# Altium schematic symbol library BARKO_SCHLIB.SchLib: 1064 symbols (part 3 of 11) (continued)
## CON-U.FL (continued)
CONN UMCC JACK STR 50OHM SMD; Manufacturer: TE Connectivity AMP; Manufacturer Part Number: 1909763-1; Body Material: Polymer,Liquid Crystal Polymer; Body Plating: Gold; Dielectric Material: Polymer; Connector System: Cable-to-Board; Number of Positions: 1; Frequency: 6GHz; Sealable: No (Without); Gender: Female; Impedance: 50R; Washability: OK; .Creator: M.OZKAN; .PCBCHK: USED; Supplier 1: Digi-Key; Supplier Part Number 1: A118077CT-ND; Stock 1: 93118; Pricing 1: 1=0.50000, 10=0.47200, 100=0.36150, 500=0.31436, 1000=0.25935 (USD); RoHS: Yes; Mount: Panel; Case/Package: SMD/SMT; Contact Plating: Gold; Contact Material: Copper Alloy; Housing Color: Beige; Insulation Material: Thermoplastic; Min Operating Temperature: -40°C; Max Operating Temperature: 194°C; Max Frequency: 6GHz; Termination: SMD/SMT; Packaging: Tape and Reel; Package Quantity: 1; Fastening Type: Push,Pull; Orientation: Straight; Connector Type: Jack; Length: 3mm; Radiation Hardening: No; ELV: Compliant; Lead Free: Lead Free; ComponentLink1URL: https://datasheet.ciiva.com/16312/eng-cd-1909763-b-16312469.pdf?src-supplier=Future+Electronics; ComponentLink1Description: https://datasheet.ciiva.com/16312/eng-cd-1909763-b-16312469.pdf?src-supplier=Future+Electronics; ComponentLink2URL: https://datasheet.ciiva.com/16469/eng-cd-1909763-b-16469221.pdf?src-supplier=Avnet+Asia; ComponentLink2Description: https://datasheet.ciiva.com/16469/eng-cd-1909763-b-16469221.pdf?src-supplier=Avnet+Asia; ComponentLink3URL: https://datasheet.ciiva.com/9423/eng-cd-1909763-b-9423785.pdf?src-supplier=Avnet; ComponentLink3Description: https://datasheet.ciiva.com/9423/eng-cd-1909763-b-9423785.pdf?src-supplier=Avnet; ComponentLink4URL: https://datasheet.ciiva.com/29191/eng-cd-1909763-b1-basefilename-29191146.pdf?src-supplier=Digi-Key; ComponentLink4Description: https://datasheet.ciiva.com/29191/eng-cd-1909763-b1-basefilename-29191146.pdf?src-supplier=Digi-Key; ComponentLink5URL: https://datasheet.ciiva.com/29191/eng-cd-1909763-b1-basefilename-29191148.pdf?src-supplier=Digi-Key; ComponentLink5Description: https://datasheet.ciiva.com/29191/eng-cd-1909763-b1-basefilename-29191148.pdf?src-supplier=Digi-Key; .SCHCHK: USED
footprint TECO-1909763-1_V (SMD, 3-Leads, Body 2.6x2.6mm, Height 1.25mm)
pins: 1, 2, 3

## CON-USB 2.0 Type B Micro
designator J?, comment USB Micro
CONN RCPT USB2.0 MICRO B SMD R/A; Manufacturer Part Number: 5UR2B01MF-105G0BUHR1; Washability: OK; .Creator: M.OZKAN; .PCBCHK: USED; .SCHCHK: USED
footprint CON-Micro USB 2.0 (Micro USB 2.0 SMT Type B Horizontal 5 Contacts)
pins: 1 VCC, 2 D-, 3 D+, 4 ID, 5 GND, S1 Shield, S2 Shield, S3 Shield, S4 Shield

## CON-USBA-SMD
designator J?  (value not drawn)
CONN USB A TYPE ULTRA FLAT SMD; Manufacturer: CNC Tech; Manufacturer Part Number: 1001-011-01101; Number of Contacts: 4; Gender: Male; .PCBCHK: USED; .Creator: F:TALI; Washability: OK; Supplier 1: Digi-Key; Stock 1: 34588; Pricing 1: 1=0.77, 10=0.72, 25=0.648, 50=0.576, 100=0.552, 250=0.504, 500=0.48, 1000=0.396, 2500=0.36 (USD); Mount: Horizontal,Surface Mount; Package Quantity: 100; Packaging: Bulk; Connector Type: USB; ComponentLink1URL: http://cnctech.us/pdfs/1001-011-01101.pdf; ComponentLink1Description: http://cnctech.us/pdfs/1001-011-01101.pdf; Supplier Part Number 1: 1175-1008-ND; .SCHCHK: USED
pins: 1 VCC (power), 2 D-, 3 D+, 4 GND (power), S1, S2

## CRYSTAL-8MHZ
designator Y?, comment 8MHZ
CRYSTAL 8.0000MHZ 20PF SMD; Manufacturer: CTS; Manufacturer Part Number: ATS08ASM-1E; Frequency Tolerance: 30ppm; ESR (Equivalent Series Resistance): 60R; Frequency Stability: 50ppm; .PCBCHK: USED; .Creator: F:TALI; Washability: OK; Supplier 1: Digi-Key; Stock 1: 18000; Pricing 1: 1000=0.1952, 3000=0.183, 5000=0.1769, 10000=0.1708 (USD); Mount: Surface Mount; Case/Package: Metal; Number of Pins: 2; Contact Plating: Copper,Silver,Tin; Min Operating Temperature: -40°C; Max Operating Temperature: 85°C; Load Capacitance: 20pF; Frequency: 8MHz; Packaging: Tape and Reel; Package Quantity: 1000; Tolerance: 30ppm; Termination: SMD/SMT; Series Resistance: 60R; Length: 0.437inch; Height: 0.169inch; Width: 3.8mm; Lead Free: Lead Free; ComponentLink1URL: http://www.ctscorp.com/wp-content/uploads/2015/11/008-0309-0.pdf; ComponentLink1Description: http://www.ctscorp.com/wp-content/uploads/2015/11/008-0309-0.pdf; ComponentLink2URL: http://www.mouser.com/ds/2/96/008-0309-0-32667.pdf; ComponentLink2Description: http://www.mouser.com/ds/2/96/008-0309-0-32667.pdf; ComponentLink3URL: http://www.ctscorp.com/wp-content/uploads/ATS-ATSSM.pdf; ComponentLink3Description: http://www.ctscorp.com/wp-content/uploads/ATS-ATSSM.pdf; ComponentLink4URL: https://www.ctscorp.com/wp-content/uploads/ATS-ATSSM.pdf; ComponentLink4Description: https://www.ctscorp.com/wp-content/uploads/ATS-ATSSM.pdf; Supplier Part Number 1: CTX1055TR-ND; .SCHCHK: USED
footprint CRYSTAL1
pins: 1, 2

## CRYSTAL-16MHZ
designator Y?, comment 16MHZ
CRYSTAL 16MHZ 12PF SMD; Manufacturer: Raltron Electronics; Manufacturer Part Number: RH100-16.000-12-3050-EX; .Creator: F:TALI; .PCBCHK: USED; Washability: OK; .SCHCHK: USED; Supplier 1: Digi-Key; Supplier Part Number 1: 2151-RH100-16.000-12-1010-EXT-TRCT-ND; Stock 1: 3000; Pricing 1: 1=0.68000, 10=0.59800, 50=0.55900, 100=0.49400, 500=0.46800, 1000=0.39000 (USD); ComponentLink1URL: http://datasheet.octopart.com/RH100-16.000-12-1010-EXT-TR-Raltron-Electronics-datasheet-137142244.pdf?src-supplier=Raltron+Electronics; ComponentLink1Description: http://datasheet.octopart.com/RH100-16.000-12-1010-EXT-TR-Raltron-Electronics-datasheet-137142244.pdf?src-supplier=Raltron+Electronics
footprint CRYSTAL-3.2X2.5
pins: 1, 2, 3, 4

## CRYSTAL-32Khz 4-SOJ
designator X?, comment ABS25-32.768K  Supplier Part Number 1: 535-9166-1-ND
CRYSTAL 32.7680KHZ 12.5PF SMD; Manufacturer: Abracon; Manufacturer Part Number: ABS25-32.768KHZ-T; Frequency: 32.768kHz; Frequency Tolerance: 20ppm; ESR (Equivalent Series Resistance): 50kR; Washability: OK; .Creator: M.OZKAN; .PCBCHK: USED; Supplier 1: Digi-Key; Stock 1: 461783; Pricing 1: 1=0.63000, 10=0.52300, 50=0.47020, 100=0.41800, 500=0.39710, 1000=0.33440 (USD); RoHS: Yes; Mount: Surface Mount; Case/Package: SMD/SMT; Number of Pins: 4; Min Operating Temperature: -40°C; Max Operating Temperature: 85°C; Load Capacitance: 12.5pF; Packaging: Tape and Reel; Package Quantity: 1000; Tolerance: 20ppm; Termination: SMD/SMT; Series Resistance: 50kR; Length: 8mm; Height: 0.098inch; Width: 0.15inch; Depth: 3.8mm; Radiation Hardening: No; Lead Free: Lead Free; REACH SVHC: No SVHC; ComponentLink1URL: https://datasheet.ciiva.com/7998/1700987-7998663.pdf?src-supplier=Element14; ComponentLink1Description: https://datasheet.ciiva.com/7998/1700987-7998663.pdf?src-supplier=Element14; ComponentLink2URL: https://datasheet.ciiva.com/854/abs25-854195.pdf?src-supplier=Digi-Key; ComponentLink2Description: https://datasheet.ciiva.com/854/abs25-854195.pdf?src-supplier=Digi-Key; ComponentLink3URL: https://datasheet.ciiva.com/854/abs25-854197.pdf?src-supplier=Digi-Key; ComponentLink3Description: https://datasheet.ciiva.com/854/abs25-854197.pdf?src-supplier=Digi-Key; ComponentLink4URL: https://datasheet.ciiva.com/16336/abs25-16336119.pdf?src-supplier=Future+Electronics; ComponentLink4Description: https://datasheet.ciiva.com/16336/abs25-16336119.pdf?src-supplier=Future+Electronics; ComponentLink5URL: https://datasheet.ciiva.com/26812/getdatasheetpartid-719721-26812171.pdf?src-supplier=Verical; ComponentLink5Description: https://datasheet.ciiva.com/26812/getdatasheetpartid-719721-26812171.pdf?src-supplier=Verical; ComponentLink6URL: https://datasheet.ciiva.com/854/abs25-854196.pdf?src-supplier=Digi-Key; ComponentLink6Description: https://datasheet.ciiva.com/854/abs25-854196.pdf?src-supplier=Digi-Key; ComponentLink7URL: https://datasheet.ciiva.com/28508/1856019-28508682.pdf?src-supplier=Element14; ComponentLink7Description: https://datasheet.ciiva.com/28508/1856019-28508682.pdf?src-supplier=Element14; .SCHCHK: USED
footprint ABRA-ABS25-4_V (SMD, 4-Leads, Body 8x3.8mm, Pitch 5.5mm, Height 2.5mm)
pins: 1 X1, 2 NC, 3 NC, 4 X2

## CRYSTAL-ABM3-8.000MHZ-D2Y-T
designator X?, comment Frequency: 8MHz  (hidden comment: CRY-ABM3-8.000MHZ)
CRYSTAL 8.0000MHZ 18PF SMD; Manufacturer: Abracon; Manufacturer Part Number: ABM3-8.000MHZ-D2Y-T; ESR (Equivalent Series Resistance): 500R; Frequency Tolerance: 20ppm; Frequency Stability: 30ppm; Washability: OK; .Creator: M.OZKAN; .PCBCHK: USED; Supplier 1: Digi-Key; Stock 1: 89429; Pricing 1: 1=1,14000, 10=1,01200, 50=0,94600, 100=0,83600, 500=0,79200 (USD); RoHS: Yes; Mount: Surface Mount; Case/Package: CSMD; Number of Pins: 2; Min Operating Temperature: -40°C; Max Operating Temperature: 85°C; Load Capacitance: 18pF; Packaging: Tape and Reel; Tolerance: 20ppm; Package Quantity: 1000; Termination: SMD/SMT; Composition: Ceramic; Series Resistance: 500R; Length: 5mm; Height: 0.051inch; Width: 3.2mm; Depth: 3.2mm; Radiation Hardening: No; REACH SVHC: Unknown; Lead Free: Lead Free; ComponentLink1URL: https://datasheet.ciiva.com/4945/abm3-47699-4945424.pdf?src-supplier=Mouser; ComponentLink1Description: https://datasheet.ciiva.com/4945/abm3-47699-4945424.pdf?src-supplier=Mouser; ComponentLink2URL: https://datasheet.ciiva.com/862/abm3-862465.pdf?src-supplier=Digi-Key; ComponentLink2Description: https://datasheet.ciiva.com/862/abm3-862465.pdf?src-supplier=Digi-Key; ComponentLink3URL: https://datasheet.ciiva.com/862/abm3-862466.pdf?src-supplier=Digi-Key; ComponentLink3Description: https://datasheet.ciiva.com/862/abm3-862466.pdf?src-supplier=Digi-Key; ComponentLink4URL: https://datasheet.ciiva.com/862/abm3-862467.pdf?src-supplier=Digi-Key; ComponentLink4Description: https://datasheet.ciiva.com/862/abm3-862467.pdf?src-supplier=Digi-Key; ComponentLink5URL: https://datasheet.ciiva.com/1357/1754353-1357270.pdf?src-supplier=Element14; ComponentLink5Description: https://datasheet.ciiva.com/1357/1754353-1357270.pdf?src-supplier=Element14; ComponentLink6URL: https://datasheet.ciiva.com/3174/abm3-3174137.pdf?src-supplier=Avnet; ComponentLink6Description: https://datasheet.ciiva.com/3174/abm3-3174137.pdf?src-supplier=Avnet; ComponentLink7URL: https://datasheet.ciiva.com/26812/getdatasheetpartid-723821-26812186.pdf?src-supplier=Verical; ComponentLink7Description: https://datasheet.ciiva.com/26812/getdatasheetpartid-723821-26812186.pdf?src-supplier=Verical; ComponentLink8URL: https://datasheet.ciiva.com/5788/abm3-5788043.pdf?src-supplier=Farnell; ComponentLink8Description: https://datasheet.ciiva.com/5788/abm3-5788043.pdf?src-supplier=Farnell; ComponentLink9URL: https://datasheet.ciiva.com/16392/abm3-16392475.pdf?src-supplier=Future+Electronics; ComponentLink9Description: https://datasheet.ciiva.com/16392/abm3-16392475.pdf?src-supplier=Future+Electronics; ComponentLink10URL: https://datasheet.ciiva.com/7998/abm3-7998589.pdf?src-supplier=Element14; ComponentLink10Description: https://datasheet.ciiva.com/7998/abm3-7998589.pdf?src-supplier=Element14; Supplier Part Number 1: 535-10630-1-ND; .SCHCHK: USED
footprint SMD_5.00x 3.20x1.3_2P - duplicate
pins: 1, 2

## CRYSTAL-ECS-3225MV
designator Y?, comment ECS-3225MV
XTAL OSC XO 16.0000MHZ HCMOS SMD; Manufacturer: ECS International; Manufacturer Part Number: ECS-3225MV-160-BN-TR; Washability: OK; .Creator: M.OZKAN; .PCBCHK: USED; Supplier 1: Digi-Key; Stock 1: 740; Pricing 1: 1=0.92000, 10=0.81700, 50=0.76380, 100=0.67510, 500=0.63954 (USD); RoHS: No; ComponentLink1URL: https://www.ecsxtal.com/store/pdf/ECS-3225MV.pdf?src-supplier=Digi-Key; ComponentLink1Description: https://www.ecsxtal.com/store/pdf/ECS-3225MV.pdf?src-supplier=Digi-Key; Supplier Part Number 1: XC2875CT-ND; .SCHCHK: USED
footprint CRYSTAL-3.2X2.5
pins: 1 NC, 2 GND, 3 OUT, 4 VDD

## CRYSTAL-RH100-25.000
designator Y?, comment 25MHz
Xtal 25MHZ 10PF SMD; Manufacturer: Raltron Electronics; Manufacturer Part Number: RH100-25.000-18-F-3030-T; Washability: OK; .Creator: M.OZKAN; .PCBCHK: USED; Supplier 1: Digi-Key; Supplier Part Number 1: 2151-RH100-25.000-10-F-2030-EXT-TRCT-ND; Stock 1: 3000; Pricing 1: 1=0.68000, 10=0.59800, 50=0.55900, 100=0.49400, 500=0.46800, 1000=0.39000 (USD); ComponentLink1URL: http://datasheet.octopart.com/RH100-25.000-10-F-2030-EXT-TR-Raltron-Electronics-datasheet-137142244.pdf?src-supplier=Raltron+Electronics; ComponentLink1Description: http://datasheet.octopart.com/RH100-25.000-10-F-2030-EXT-TR-Raltron-Electronics-datasheet-137142244.pdf?src-supplier=Raltron+Electronics; .SCHCHK: USED
footprint CRYSTAL-3.2X2.5
pins: 1, 2, 3, 4

## CRYSTAL-TSX-3225 16.0000MF18X-AC0
designator Y?, comment 16MHz
CRYSTAL 16.00 MHZ 9PF SMD; Manufacturer: Epson; Manufacturer Part Number: TSX-3225 16.0000MF18X-AC0; ESR (Equivalent Series Resistance): 60R; Frequency Stability: 18ppm; Frequency Tolerance: 10ppm; Supplier 1: Digi-Key; Supplier Part Number 1: SER4070CT-ND; Stock: 467; Pricing: 1=0.33, 10=0.275, 50=0.2476, 100=0.22, 500=0.209 (USD); RoHS: Yes; Mount: Surface Mount; Case/Package: SMD/SMT; Min Operating Temperature: -20°C; Max Operating Temperature: 75°C; Packaging: Tape and Reel; Frequency: 16MHz; Load Capacitance: 9pF; Length: 0.126inch; Width: 0.098inch; Height: 0.024inch; ComponentLink1URL: https://www.eea.epson.com/wp-content/uploads/2016/11/November-2016-PCS-MASTER-BOOK.pdf?src-supplier=Verical; ComponentLink1Description: https://www.eea.epson.com/wp-content/uploads/2016/11/November-2016-PCS-MASTER-BOOK.pdf?src-supplier=Verical; ComponentLink2URL: https://www5.epsondevice.com/en/information/support/pdf/june_2018_psc_masterbook.pdf?src-supplier=Digi-Key; ComponentLink2Description: https://www5.epsondevice.com/en/information/support/pdf/june_2018_psc_masterbook.pdf?src-supplier=Digi-Key; ComponentLink3URL: https://www.eea.epson.com/wp-content/uploads/2016/11/November-2016-PCS-MASTER-BOOK.pdf?src-supplier=Mouser; ComponentLink3Description: https://www.eea.epson.com/wp-content/uploads/2016/11/November-2016-PCS-MASTER-BOOK.pdf?src-supplier=Mouser; ComponentLink4URL: https://www.eea.epson.com/wp-content/uploads/2016/11/November-2016-PCS-MASTER-BOOK.pdf?src-supplier=Dove; ComponentLink4Description: https://www.eea.epson.com/wp-content/uploads/2016/11/November-2016-PCS-MASTER-BOOK.pdf?src-supplier=Dove
footprint CRY-TSX-3225
pins: 1, 2, 3, 4

## CRYSTAL-TSX-3225 25.0000MF18X-G0
designator Y?, comment 25MHz
CRYSTAL 25.0000MHZ 20PF SMD; Manufacturer: Epson; Manufacturer Part Number: TSX-3225 25.0000MF18X-G0; ESR (Equivalent Series Resistance): 40R; Frequency Stability: 18ppm; Frequency Tolerance: 10ppm; Supplier 1: Digi-Key; Supplier Part Number 1: SER4375CT-ND; Stock: 1703; Pricing: 1=0.33, 10=0.275, 50=0.2476, 100=0.22, 500=0.209 (USD); RoHS: Yes; Mount: Surface Mount; Case/Package: SMD/SMT; Min Operating Temperature: -40°C; Max Operating Temperature: 85°C; Packaging: Tape and Reel; Frequency: 25MHz; Load Capacitance: 20pF; Length: 0.126inch; Width: 0.098inch; Height: 0.024inch; ComponentLink1URL: https://support.epson.biz/td/api/doc_check.php?dl=brief_FA-238V_en.pdf&src-supplier=Digi-Key; ComponentLink1Description: https://support.epson.biz/td/api/doc_check.php?dl=brief_FA-238V_en.pdf&src-supplier=Digi-Key; ComponentLink2URL: https://www5.epsondevice.com/en/information/support/pdf/june_2018_psc_masterbook.pdf?src-supplier=Digi-Key; ComponentLink2Description: https://www5.epsondevice.com/en/information/support/pdf/june_2018_psc_masterbook.pdf?src-supplier=Digi-Key; ComponentLink3URL: https://support.epson.biz/td/api/doc_check.php?dl=brief_TSX-3225&amp;lang=en&src-supplier=Digi-Key; ComponentLink3Description: https://support.epson.biz/td/api/doc_check.php?dl=brief_TSX-3225&amp;lang=en&src-supplier=Digi-Key
footprint CRY-TSX-3225
pins: 1, 2, 3, 4

## D-1N4148W-SOD123
designator D?, comment 1N4148W  Forward Current: 150mA  Package / Case: SOD-123
DIODE GEN PURP 100V 150MA SOD123; Manufacturer: MCC; Manufacturer Part Number: 1N4148W-TP; Max Surge Current: 2A; Forward Voltage: 1V; Recovery Time: 4ns; Max Reverse Leakage Current: 5uA; Power Dissipation: 400mW; Max Forward Surge Current (Ifsm): 1A; Element Configuration: Single; Polarity: Standard; Capacitance: 4pF; .PCBCHK: USED; .Creator: F:TALI; Washability: OK; Supplier 1: Digi-Key; Stock 1: 1558891; Pricing 1: 1=0.14, 10=0.131, 100=0.0856, 500=0.04186, 1000=0.02854 (USD); Mount: Surface Mount; Number of Pins: 2; Min Operating Temperature: -65°C; Max Operating Temperature: 150°C; Packaging: Tape and Reel; Package Quantity: 3000; Average Rectified Current: 150mA; Reverse Recovery Time: 4ns; Max Repetitive Reverse Voltage (Vrrm): 100V; Peak Non-Repetitive Surge Current: 2A; Voltage Rating (DC): 100V; Current Rating: 150mA; Output Current: 150mA; Max Reverse Voltage (DC): 100V; Length: 2.85mm; Height: 1.2mm; Width: 1.8mm; Radiation Hardening: No; REACH SVHC: Unknown; Lead Free: Lead Free; ComponentLink1URL: http://www.farnell.com/datasheets/1684829.pdf; ComponentLink1Description: http://www.farnell.com/datasheets/1684829.pdf; ComponentLink2URL: http://www.mccsemi.com/up_pdf/1N4148W(SOD123).pdf; ComponentLink2Description: http://www.mccsemi.com/up_pdf/1N4148W(SOD123).pdf; ComponentLink3URL: http://www.mouser.com/ds/2/258/1N4148W(SOD123)-349435.pdf; ComponentLink3Description: http://www.mouser.com/ds/2/258/1N4148W(SOD123)-349435.pdf; ComponentLink4URL: http://www.alliedelec.com/images/products/datasheets/bm/MCC/70055519.pdf; ComponentLink4Description: http://www.alliedelec.com/images/products/datasheets/bm/MCC/70055519.pdf; Supplier Part Number 1: 1N4148WTPMSDKR-ND; Parameter 2: *; .SCHCHK: USED
footprint D-SOD123
pins: A, C

## D-1SMA5938BT3G
designator D?, comment 1SMA5938BT3G  Case/Package: SMA
DIODE ZENER 36V 1.5W SMA; Manufacturer: ON Semiconductor; Tolerance: 5%; Max Reverse Leakage Current: 500nA; Impedance: 38R; Test Current: 10.4mA; Element Configuration: Single; ESD Protection: Yes; Forward Voltage: 1.5V; Zener Current: 42mA; Power Dissipation: 500mW; .Creator: F:TALI; .PCBCHK: USED; Washability: OK; Supplier 1: Digi-Key; Manufacturer Part Number: 1SMA5938BT3G; Stock 1: 6046; Pricing 1: 1=0.5, 10=0.374, 100=0.233, 500=0.15944, 1000=0.12264 (USD); Number of Pins: 2; Contact Plating: Matte,Tin; Min Operating Temperature: -65°C; Max Operating Temperature: 150°C; Max Power Dissipation: 1.5W; Package Quantity: 1; Packaging: Tape and Reel; Zener Voltage: 36V; Voltage Tolerance: 5%; Working Voltage: 36V; Peak Reverse Current: 500nA; Power Rating: 1.5W; Voltage Rating (DC): 36V; Length: 4.57mm; Height: 2.05mm; Width: 2.92mm; Radiation Hardening: No; Lead Free: Lead Free; Halogen Free: Halogen Free; REACH SVHC: No SVHC; ComponentLink1URL: http://www.onsemi.com/pub_link/Collateral/1SMA5913BT3-D.PDF; ComponentLink1Description: http://www.onsemi.com/pub_link/Collateral/1SMA5913BT3-D.PDF; ComponentLink2URL: http://www.onsemi.com/pub/Collateral/1SMA5913BT3-D.PDF; ComponentLink2Description: http://www.onsemi.com/pub/Collateral/1SMA5913BT3-D.PDF; ComponentLink3URL: https://www.onsemi.com/pub/Collateral/1SMA5913BT3-D.PDF; ComponentLink3Description: https://www.onsemi.com/pub/Collateral/1SMA5913BT3-D.PDF; Supplier Part Number 1: 1SMA5938BT3GOSDKR-ND; .SCHCHK: USED
footprint D-SMA-DO214AC
pins: A, C

## D-B260A-SMA
designator D?, comment B260A  Average Rectified Current: 2A  Case/Package: SMA
DIODE SCHOTTKY 60V 2A SMA; Manufacturer: Diodes; Manufacturer Part Number: B260A-13-F; Forward Voltage: 700mV; Peak Reverse Current: 500uA; Max Forward Surge Current (Ifsm): 50A; Element Configuration: Single; Polarity: Standard; Capacitance: 200pF; .PCBCHK: USED; .Creator: F:TALI; Washability: OK; Supplier 1: Digi-Key; Supplier Part Number 1: B260A-FDICT-ND; Stock 1: 380908; Pricing 1: 1=0.48, 10=0.359, 100=0.2239, 500=0.15318, 1000=0.11783 (USD); Mount: Surface Mount; Number of Pins: 2; Weight: 0.002258oz; Contact Plating: Matte,Tin; Min Operating Temperature: -65°C; Max Operating Temperature: 150°C; Packaging: Tape and Reel; Forward Current: 2A; Package Quantity: 5000; Max Repetitive Reverse Voltage (Vrrm): 60V; Peak Non-Repetitive Surge Current: 50A; Termination: SMD/SMT; Voltage Rating (DC): 60V; Current Rating: 2A; Output Current: 2A; Max Reverse Voltage (DC): 60V; Length: 4.6mm; Height: 2.1mm; Width: 2.92mm; Radiation Hardening: No; REACH SVHC: No SVHC; Lead Free: Lead Free; ComponentLink1URL: https://www.verical.com/server-webapp/html/getDatasheet?partID=143171; ComponentLink1Description: https://www.verical.com/server-webapp/html/getDatasheet?partID=143171; ComponentLink2URL: http://www.diodes.com/datasheets/ds13004.pdf; ComponentLink2Description: http://www.diodes.com/datasheets/ds13004.pdf; ComponentLink3URL: http://www.jameco.com/Jameco/Products/ProdDS/1589515.pdf; ComponentLink3Description: http://www.jameco.com/Jameco/Products/ProdDS/1589515.pdf; .SCHCHK: USED
footprint D-SMA-DO214AC
pins: A, C

## D-BAS16LT1G
designator D?, comment BAS16LT1G  Case/Package: SOT-23-3  Forward Current: 200mA  Voltage Rating (DC): 75V
DIODE GEN PURP 75V 200MA SOT23-3; Manufacturer 1: ON Semiconductor; Element Configuration: Single; Peak Reverse Current: 1uA; Reverse Recovery Time: 6ns; Max Surge Current: 500mA; Forward Voltage: 1.25V; Power Dissipation: 300mW; Polarity: Standard; Capacitance: 2pF; Washability: OK; .Creator: M.OZKAN; .PCBCHK: USED; Supplier 1: Digi-Key; Manufacturer Part Number 1: BAS16LT1G; Stock 1: 1477489; Pricing 1: 1=0,10000, 10=0,09200, 100=0,03850, 500=0,03024, 1000=0,02100 (USD); RoHS: Yes; Number of Pins: 3; Contact Plating: Tin,Matte; Min Operating Temperature: -55°C; Max Operating Temperature: 150°C; Max Repetitive Reverse Voltage (Vrrm): 75V; Recovery Time: 6ns; Package Quantity: 1; Packaging: Tape and Reel; Max Reverse Leakage Current: 1uA; Average Rectified Current: 200mA; Max Reverse Voltage (DC): 75V; Peak Non-Repetitive Surge Current: 500mA; Max Forward Surge Current (Ifsm): 500mA; Current Rating: 200mA; Output Current: 200mA; Length: 0.119inch; Height: 0.04inch; Width: 0.055inch; Radiation Hardening: No; Lead Free: Lead Free; Halogen Free: Halogen Free; REACH SVHC: No SVHC; ComponentLink1URL: https://datasheet.ciiva.com/4434/bas16lt1-d-103448-4434931.pdf?src-supplier=Mouser; ComponentLink1Description: https://datasheet.ciiva.com/4434/bas16lt1-d-103448-4434931.pdf?src-supplier=Mouser; ComponentLink2URL: https://datasheet.ciiva.com/915/bas16lt1-d-915318.pdf?src-supplier=Digi-Key; ComponentLink2Description: https://datasheet.ciiva.com/915/bas16lt1-d-915318.pdf?src-supplier=Digi-Key; ComponentLink3URL: https://datasheet.ciiva.com/1179/bas16lt1-d-1179718.pdf?src-supplier=Element14; ComponentLink3Description: https://datasheet.ciiva.com/1179/bas16lt1-d-1179718.pdf?src-supplier=Element14; ComponentLink4URL: https://datasheet.ciiva.com/8291/bas16lt1-d-8291894.pdf?src-supplier=Avnet; ComponentLink4Description: https://datasheet.ciiva.com/8291/bas16lt1-d-8291894.pdf?src-supplier=Avnet; ComponentLink5URL: https://datasheet.ciiva.com/915/bas16lt1-d-915319.pdf?src-supplier=Digi-Key; ComponentLink5Description: https://datasheet.ciiva.com/915/bas16lt1-d-915319.pdf?src-supplier=Digi-Key; ComponentLink6URL: https://datasheet.ciiva.com/1179/bas16lt1-d-1179719.pdf?src-supplier=Element14; ComponentLink6Description: https://datasheet.ciiva.com/1179/bas16lt1-d-1179719.pdf?src-supplier=Element14; ComponentLink7URL: https://datasheet.ciiva.com/915/bas16lt1-d-915320.pdf?src-supplier=Digi-Key; ComponentLink7Description: https://datasheet.ciiva.com/915/bas16lt1-d-915320.pdf?src-supplier=Digi-Key; ComponentLink8URL: https://datasheet.ciiva.com/16387/bas16lt1-d-16387673.pdf?src-supplier=Future+Electronics; ComponentLink8Description: https://datasheet.ciiva.com/16387/bas16lt1-d-16387673.pdf?src-supplier=Future+Electronics; ComponentLink9URL: https://datasheet.ciiva.com/22663/1708231-22663642.pdf?src-supplier=Element14; ComponentLink9Description: https://datasheet.ciiva.com/22663/1708231-22663642.pdf?src-supplier=Element14; ComponentLink10URL: https://datasheet.ciiva.com/25950/bas16lt1-d-25950207.pdf?src-supplier=Avnet+Europe; ComponentLink10Description: https://datasheet.ciiva.com/25950/bas16lt1-d-25950207.pdf?src-supplier=Avnet+Europe; Supplier Part Number 1: BAS16LT1GOSCT-ND; .SCHCHK: USED
footprint SOT23-3
pins: 1 A, 3 K

## D-BAS116-7-F
designator D?, comment BAS116-7-F  Case/Package: SOT-23  Forward Current: 215mA
DIODE GEN PURP 85V 215MA SOT23-3; Manufacturer: Diodes; Reverse Recovery Time: 3us; Peak Non-Repetitive Surge Current: 4A; Element Configuration: Single; Forward Voltage: 1.25V; Max Reverse Current: 5nA; Max Power Dissipation: 150mW; Power Dissipation: 250mW; Polarity: Standard; Capacitance: 2pF; Output Current: 250mA; Supplier 1: Digi-Key; Manufacturer Part Number: BAS116-7-F; Stock 1: 48988; Pricing 1: 1=0,20000, 10=0,17700, 100=0,08340, 500=0,04950, 1000=0,03323 (USD); RoHS: Yes; Mount: Surface Mount; Number of Pins: 3; Weight: 0.000282oz; Contact Plating: Tin,Matte; Min Operating Temperature: -65°C; Max Operating Temperature: 150°C; Max Repetitive Reverse Voltage (Vrrm): 85V; Max Surge Current: 4A; Package Quantity: 3000; Packaging: Tape and Reel; Recovery Time: 3us; Reverse Voltage (DC): 85V; Average Rectified Current: 215mA; Max Forward Surge Current (Ifsm): 4A; Voltage Rating (DC): 85V; Power Rating: 250mW; Current Rating: 215mA; Max Reverse Voltage (DC): 85V; Length: 3.05mm; Height: 1mm; Width: 1.4mm; Radiation Hardening: No; REACH SVHC: No SVHC; Lead Free: Lead Free; ComponentLink1URL: https://datasheet.ciiva.com/911/ds30233-911846.pdf?src-supplier=Digi-Key; ComponentLink1Description: https://datasheet.ciiva.com/911/ds30233-911846.pdf?src-supplier=Digi-Key; ComponentLink2URL: https://datasheet.ciiva.com/1179/ds30233-1179654.pdf?src-supplier=Element14; ComponentLink2Description: https://datasheet.ciiva.com/1179/ds30233-1179654.pdf?src-supplier=Element14; ComponentLink3URL: https://datasheet.ciiva.com/15144/getdatasheetpartid-35589-15144022.pdf?src-supplier=Verical; ComponentLink3Description: https://datasheet.ciiva.com/15144/getdatasheetpartid-35589-15144022.pdf?src-supplier=Verical; ComponentLink4URL: https://datasheet.ciiva.com/911/ds30233-911847.pdf?src-supplier=Digi-Key; ComponentLink4Description: https://datasheet.ciiva.com/911/ds30233-911847.pdf?src-supplier=Digi-Key; ComponentLink5URL: https://datasheet.ciiva.com/911/ds30233-911848.pdf?src-supplier=Digi-Key; ComponentLink5Description: https://datasheet.ciiva.com/911/ds30233-911848.pdf?src-supplier=Digi-Key; ComponentLink6URL: https://datasheet.ciiva.com/4453/ds30233-18535-4453579.pdf?src-supplier=Mouser; ComponentLink6Description: https://datasheet.ciiva.com/4453/ds30233-18535-4453579.pdf?src-supplier=Mouser; ComponentLink7URL: https://datasheet.ciiva.com/8303/ds30233-8303195.pdf?src-supplier=Avnet; ComponentLink7Description: https://datasheet.ciiva.com/8303/ds30233-8303195.pdf?src-supplier=Avnet
footprint SOT23-3
pins: A, C

## D-BAT54A
designator D?, comment BAT54A  Case/Package: SOT-23-3
DIODE ARRAY SCHOTTKY 30V SOT23-3; Manufacturer: ON Semiconductor / Fairchild; Forward Voltage: 800mV; Element Configuration: Common Anode; Current Rating: 200mA; Reverse Recovery Time: 5ns; Max Forward Surge Current (Ifsm): 600mA; Capacitance: 10pF; Peak Reverse Current: 2uA; Power Dissipation: 290mW; .Creator: F:TALI; .PCBCHK: USED; Washability: OK; Supplier 1: Digi-Key; Manufacturer Part Number: BAT54A; Stock 1: 29533; Pricing 1: 1=0.28, 10=0.23, 100=0.122, 500=0.08028, 1000=0.05459 (USD); Mount: Surface Mount; Number of Pins: 3; Weight: 0.025g; Contact Plating: Matte,Tin; Min Operating Temperature: -55°C; Max Operating Temperature: 150°C; Packaging: Tape and Reel; Voltage Rating (DC): 30V; Forward Current: 200mA; Max Repetitive Reverse Voltage (Vrrm): 30V; Package Quantity: 1; Peak Non-Repetitive Surge Current: 600mA; Average Rectified Current: 200mA; Max Reverse Voltage (DC): 30V; Length: 2.92mm; Height: 0.93mm; Width: 1.3mm; Radiation Hardening: No; REACH SVHC: No SVHC; Lead Free: Lead Free; ComponentLink1URL: http://www.farnell.com/datasheets/2285880.pdf; ComponentLink1Description: http://www.farnell.com/datasheets/2285880.pdf; ComponentLink2URL: https://www.fairchildsemi.com/package-drawings/MA/MA03B.pdf; ComponentLink2Description: https://www.fairchildsemi.com/package-drawings/MA/MA03B.pdf; ComponentLink3URL: http://www.fairchildsemi.com/ds/BA/BAT54A.pdf; ComponentLink3Description: http://www.fairchildsemi.com/ds/BA/BAT54A.pdf; ComponentLink4URL: https://www.verical.com/server-webapp/html/getDatasheet?partID=86888; ComponentLink4Description: https://www.verical.com/server-webapp/html/getDatasheet?partID=86888; ComponentLink5URL: https://media.digikey.com/pdf/Data%20Sheets/ON%20Semiconductor%20PDFs/BAT54(A,C,S).pdf; ComponentLink5Description: https://media.digikey.com/pdf/Data%20Sheets/ON%20Semiconductor%20PDFs/BAT54(A,C,S).pdf; Supplier Part Number 1: BAT54AFSDKR-ND; .SCHCHK: USED
footprint SOT23-3
pins: 1, 2, 3

## D-BAT54Z-SOD123
designator D?, comment BAT54Z  Average Rectified Current: 300mA  Package / Case: SOD-123
DIODE SCHOTTKY 40V 300MA SOD123; Manufacturer: STMicroelectronics; Manufacturer Part Number: BAT54ZFILM; Forward Voltage: 900mV; Max Surge Current: 1A; Recovery Time: 5ns; Max Reverse Leakage Current: 1uA; Peak Reverse Current: 100uA; Element Configuration: Single; Polarity: Standard; Capacitance: 7pF; .PCBCHK: USED; .Creator: F:TALI; Washability: OK; Supplier 1: Digi-Key; Supplier Part Number 1: 497-5562-6-ND; Stock 1: 43044; Pricing 1: 1=0.35, 10=0.26, 100=0.147, 500=0.09734, 1000=0.07462 (USD); Mount: Surface Mount; Number of Pins: 2; Contact Plating: Matte,Tin; Min Operating Temperature: -40°C; Max Operating Temperature: 150°C; Package Quantity: 1; Packaging: Tape and Reel; Reverse Recovery Time: 5ns; Max Repetitive Reverse Voltage (Vrrm): 40V; Peak Non-Repetitive Surge Current: 1A; Voltage Rating (DC): 40V; Current Rating: 300mA; Output Current: 300mA; Forward Current: 300mA; Max Reverse Voltage (DC): 40V; Lead Free: Lead Free; ComponentLink1URL: http://www.st.com/web/en/resource/technical/document/datasheet/CD00001322.pdf; ComponentLink1Description: http://www.st.com/web/en/resource/technical/document/datasheet/CD00001322.pdf; ComponentLink2URL: http://www.st.com/content/ccc/resource/technical/document/datasheet/07/50/54/f2/0d/ba/4a/79/CD00001322.pdf/files/CD00001322.pdf/jcr:content/translations/en.CD00001322.pdf; ComponentLink2Description: http://www.st.com/content/ccc/resource/technical/document/datasheet/07/50/54/f2/0d/ba/4a/79/CD00001322.pdf/files/CD00001322.pdf/jcr:content/translations/en.CD00001322.pdf; .SCHCHK: USED
footprint D-SOD123
pins: A, C

## D-BAV70-SOT-23-3
designator D?, comment BAV70  Case/Package: SOT-23-3
DIODE ARRAY GP 80V 200MA SOT23-3 3; Manufacturer: Panasonic; Max Surge Current: 500mA; Recovery Time: 2ns; Element Configuration: Common Cathode; Max Reverse Leakage Current: 100nA; Voltage Rating (DC): 70V; Capacitance: 1.5pF; Forward Voltage: 1V; .PCBCHK: USED; .Creator: F:TALI; Washability: OK; Supplier 1: Digi-Key; Supplier Part Number 1: BAV70PSCT-ND; Manufacturer Part Number: BAV70; Stock 1: 0; Mount: Surface Mount; Number of Pins: 3; Min Operating Temperature: -40°C; Max Operating Temperature: 85°C; Packaging: Tape and Reel; Package Quantity: 3000; Average Rectified Current: 200mA; Current Rating: 200mA; Max Reverse Voltage (DC): 80V; REACH SVHC: No SVHC; Lead Free: Lead Free; ComponentLink1URL: http://www.mouser.com/ds/2/315/BAV70_E-472112.pdf; ComponentLink1Description: http://www.mouser.com/ds/2/315/BAV70_E-472112.pdf; .SCHCHK: USED
footprint SOT23-3
pins: 1, 2, 3

## D-BAV70S,115
designator D?, comment BAV70S,115  Case/Package: TSSOP6
DIODE ARRAY GP 100V 250MA 6TSSOP; Manufacturer: NXP Semiconductors; Element Configuration: Common Cathode; Forward Voltage: 1.25V; Reverse Recovery Time: 4ns; Peak Non-Repetitive Surge Current: 4A; Peak Reverse Current: 500nA; Power Dissipation: 350mW; .Creator: F:TALI; .PCBCHK: USED; Washability: OK; Supplier 1: Digi-Key; Manufacturer Part Number: BAV70S,115; Stock 1: 142855; Pricing 1: 1=0.42, 10=0.315, 100=0.1786, 500=0.11828, 1000=0.09068 (USD); Mount: Surface Mount; Number of Pins: 6; Weight: 0.01lb; Contact Plating: Tin; Min Operating Temperature: -65°C; Max Operating Temperature: 150°C; Packaging: Tape and Reel; Forward Current: 250mA; Max Repetitive Reverse Voltage (Vrrm): 100V; Package Quantity: 1; Max Surge Current: 4A; Recovery Time: 4ns; Average Rectified Current: 250mA; Max Reverse Leakage Current: 500nA; Max Forward Surge Current (Ifsm): 4A; Max Reverse Voltage (DC): 100V; Length: 2.2mm; Height: 1mm; Width: 1.35mm; Radiation Hardening: No; REACH SVHC: No SVHC; Lead Free: Lead Free; ComponentLink1URL: http://www.nxp.com/documents/data_sheet/BAV70_SER.pdf; ComponentLink1Description: http://www.nxp.com/documents/data_sheet/BAV70_SER.pdf; ComponentLink2URL: http://www.farnell.com/datasheets/1914003.pdf; ComponentLink2Description: http://www.farnell.com/datasheets/1914003.pdf; Supplier Part Number 1: 1727-4310-6-ND; .SCHCHK: USED
footprint TSSOP6(SOT363)
part A pins: 1, 2, 6
part B pins: 3, 4, 5

## D-BZT52C6V8-7-F-SOD123
designator D?, comment Voltage Rating (DC): 6.8V  (hidden comment: BZT52C6V8)
DIODE ZENER 6.8V 500MW SOD123; Manufacturer: Diodes; Manufacturer Part Number: BZT52C6V8-7-F; Max Reverse Leakage Current: 2uA; Element Configuration: Single; Tolerance: 6%; Forward Voltage: 900mV; Impedance: 15R; Zener Current: 5mA; Output Current: 45mA; ESD Protection: No; Washability: OK; .Creator: M.OZKAN; .PCBCHK: USED; Supplier 1: Digi-Key; Stock 1: 28515; Pricing 1: 1=0.20000, 10=0.16600, 100=0.08810, 500=0.05794, 1000=0.03940 (USD); RoHS: Yes; Mount: Surface Mount; Number of Pins: 2; Weight: 0.000353oz; Contact Plating: Tin,Matte; Min Operating Temperature: -65°C; Max Operating Temperature: 150°C; Max Power Dissipation: 500mW; Zener Voltage: 6.8V; Packaging: Tape and Reel; Package Quantity: 3000; Power Dissipation: 500mW; Voltage Tolerance: 6%; Test Current: 5mA; Working Voltage: 6.8V; Peak Reverse Current: 2uA; Termination: SMD/SMT; Power Rating: 500mW; Length: 2.85mm; Height: 1.35mm; Width: 1.7mm; Radiation Hardening: No; Lead Free: Lead Free; ComponentLink1URL: https://datasheet.ciiva.com/15142/getdatasheetpartid-61176-15142294.pdf?src-supplier=Verical; ComponentLink1Description: https://datasheet.ciiva.com/15142/getdatasheetpartid-61176-15142294.pdf?src-supplier=Verical; ComponentLink2URL: https://datasheet.ciiva.com/25623/0900766b8104bde6-25623750.pdf?src-supplier=RSComponents; ComponentLink2Description: https://datasheet.ciiva.com/25623/0900766b8104bde6-25623750.pdf?src-supplier=RSComponents; Supplier Part Number 1: BZT52C6V8-FDICT-ND; .SCHCHK: USED
footprint D-SOD123
pins: A, C

## D-BZT52C10-SOD123
designator D?, comment BZT52C10  Zener Voltage: 10V  Case/Package: SOD-123-2
DIODE ZENER 10V 500MW SOD123; Manufacturer: Diodes; Manufacturer Part Number: BZT52C10-7-F; Tolerance: 6%; Forward Voltage: 900mV; Impedance: 20R; Zener Current: 5mA; Peak Reverse Current: 200nA; Element Configuration: Single; Output Current: 50mA; ESD Protection: No; .PCBCHK: USED; .Creator: F:TALI; Forward Current: 250mA; Reverse Recovery Time: 4ns; Max Repetitive Reverse Voltage (Vrrm): 100V; Peak Non-Repetitive Surge Current: 4A; Washability: OK; Supplier 1: Digi-Key; Supplier Part Number 1: BZT52C10-FDIDKR-ND; Stock 1: 339; Pricing 1: 1=0.24, 10=0.218, 100=0.1186, 500=0.07296, 1000=0.04975 (USD); Mount: Surface Mount; Number of Pins: 2; Weight: 0.000353oz; Contact Plating: Matte,Tin; Min Operating Temperature: -65°C; Max Operating Temperature: 150°C; Package Quantity: 3000; Packaging: Tape and Reel; Max Power Dissipation: 500mW; Voltage Tolerance: 6%; Test Current: 5mA; Power Dissipation: 500mW; Max Reverse Leakage Current: 200nA; Working Voltage: 10V; Termination: SMD/SMT; Power Rating: 500mW; Voltage Rating (DC): 10V; Length: 2.85mm; Height: 1.35mm; Width: 1.7mm; Radiation Hardening: No; Lead Free: Lead Free; ComponentLink1URL: https://www.diodes.com/assets/Datasheets/ds18004.pdf; ComponentLink1Description: https://www.diodes.com/assets/Datasheets/ds18004.pdf; ComponentLink2URL: http://www.jameco.com/Jameco/Products/ProdDS/1539497.pdf; ComponentLink2Description: http://www.jameco.com/Jameco/Products/ProdDS/1539497.pdf; Supplier 2: Digi-Key; Supplier Part Number 2: MMSZ5240B-FDIDKR-ND; Stock 2: 34933; Pricing 2: 1=0.25, 10=0.204, 100=0.108, 500=0.07108, 1000=0.04833 (USD); ComponentLink3URL: https://www.verical.com/server-webapp/html/getDatasheet?partID=110273; ComponentLink3Description: https://www.verical.com/server-webapp/html/getDatasheet?partID=110273; ComponentLink4URL: http://www.diodes.com/_files/datasheets/ds18010.pdf; ComponentLink4Description: http://www.diodes.com/_files/datasheets/ds18010.pdf; ComponentLink5URL: http://www.jameco.com/Jameco/Products/ProdDS/1541167.pdf; ComponentLink5Description: http://www.jameco.com/Jameco/Products/ProdDS/1541167.pdf; Supplier 3: Digi-Key; Supplier Part Number 3: MMSZ5240B-HE3-08GICT-ND; Stock 3: 14290; Pricing 3: 1=0.3, 10=0.244, 25=0.2044, 100=0.1295, 250=0.09992, 500=0.08516, 1000=0.05791 (USD); ComponentLink6URL: http://www.mouser.com/ds/2/427/mmsz5225-102133.pdf; ComponentLink6Description: http://www.mouser.com/ds/2/427/mmsz5225-102133.pdf; .SCHCHK: USED; Max Surge Current: 4A; Recovery Time: 4ns; Average Rectified Current: 250mA; Max Forward Surge Current (Ifsm): 4A; Max Reverse Voltage (DC): 100V; REACH SVHC: No SVHC; ComponentLink7URL: http://www.nxp.com/documents/data_sheet/BAV70_SER.pdf; ComponentLink7Description: http://www.nxp.com/documents/data_sheet/BAV70_SER.pdf; ComponentLink8URL: http://www.farnell.com/datasheets/1914003.pdf; ComponentLink8Description: http://www.farnell.com/datasheets/1914003.pdf
footprint D-SOD123
pins: A, C

## D-BZT585B5V1T-7
designator D?, comment BZT585B5V1  Zener Voltage: 5.1V
DIODE ZENER 5.1V 350MW SOD523; Manufacturer: Diodes; Manufacturer Part Number: BZT585B5V1T-7; Impedance: 60R; Tolerance: 2%; Element Configuration: Single; Zener Current: 5mA; Peak Reverse Current: 2uA; Forward Voltage: 900mV; ESD Protection: No; Washability: OK; .Creator: M.OZKAN; .PCBCHK: USED; Supplier 1: Digi-Key; Stock 1: 6784; Pricing 1: 1=0.22000, 10=0.18000, 100=0.09570, 500=0.06296, 1000=0.04281 (USD); RoHS: Yes; Mount: Surface Mount; Case/Package: SOD-523-2; Number of Pins: 2; Weight: 3.5E-05oz; Contact Plating: Tin,Matte; Min Operating Temperature: -65°C; Max Operating Temperature: 150°C; Packaging: Tape and Reel; Max Power Dissipation: 350mW; Voltage Tolerance: 2%; Package Quantity: 3000; Max Reverse Leakage Current: 2uA; Test Current: 5mA; ComponentLink1URL: http://www.mouser.com/ds/2/115/BZT585BxVxT-318149.pdf?src-supplier=Mouser; ComponentLink1Description: http://www.mouser.com/ds/2/115/BZT585BxVxT-318149.pdf?src-supplier=Mouser; ComponentLink2URL: https://www.diodes.com/assets/Datasheets/BZT585BxVxT.pdf?src-supplier=Digi-Key; ComponentLink2Description: https://www.diodes.com/assets/Datasheets/BZT585BxVxT.pdf?src-supplier=Digi-Key; ComponentLink3URL: http://diodes.com/datasheets/BZT585BxVxT.pdf?src-supplier=Avnet; ComponentLink3Description: http://diodes.com/datasheets/BZT585BxVxT.pdf?src-supplier=Avnet; Supplier Part Number 1: BZT585B5V1T-7DICT-ND; .SCHCHK: USED
footprint D-SOD523
pins: A, C

## D-CMHZ5265-SOD123
designator D?, comment CMHZ5265  Zener Voltage: 62V  Package / Case: SOD-123
DIODE ZENER 62V 250MW SOD123; Manufacturer: Central Semiconductor; Manufacturer Part Number: CMHZ5265BTR; Impedance: 185R; Tolerance: 5%; Material: Plastic; Max Reverse Leakage Current: 100nA; Test Current: 2mA; Element Configuration: Single; Forward Voltage: 900mV; Power Dissipation: 500mW; Zener Current: 10mA; ESD Protection: Yes; .PCBCHK: USED; .Creator: F:TALI; Washability: OK; Supplier 1: Digi-Key; Supplier Part Number 1: CMHZ5265BDKR-ND; Stock 1: 29816; Pricing 1: 1=0.49, 10=0.415, 25=0.3632, 100=0.3115, 250=0.26996, 500=0.22842, 1000=0.1765 (USD); Mount: Surface Mount; Min Operating Temperature: -65°C; Max Operating Temperature: 150°C; Packaging: Tape and Reel; Max Power Dissipation: 250mW; Supplier 2: Digi-Key; Supplier Part Number 2: MMSZ5265BT1GOSDKR-ND; Stock 2: 630; Pricing 2: 1=0.25, 10=0.201, 100=0.1067, 500=0.07016, 1000=0.04771 (USD); Case/Package: SOD-123-2; Number of Pins: 2; Contact Plating: Matte,Tin; Package Quantity: 1; Voltage Tolerance: 5%; Working Voltage: 62V; Peak Reverse Current: 100nA; Voltage Rating (DC): 62V; Power Rating: 500mW; Length: 2.84mm; Height: 1.25mm; Width: 1.8mm; Radiation Hardening: No; Lead Free: Lead Free; REACH SVHC: No SVHC; ComponentLink1URL: https://www.verical.com/server-webapp/html/getDatasheet?partID=75754; ComponentLink1Description: https://www.verical.com/server-webapp/html/getDatasheet?partID=75754; ComponentLink2URL: http://www.onsemi.com/pub/Collateral/MMSZ5221BT1-D.PDF; ComponentLink2Description: http://www.onsemi.com/pub/Collateral/MMSZ5221BT1-D.PDF; ComponentLink3URL: http://www.farnell.com/datasheets/661777.pdf; ComponentLink3Description: http://www.farnell.com/datasheets/661777.pdf; ComponentLink4URL: http://www.mouser.com/ds/2/308/MMSZ5221BT1-D-85810.pdf; ComponentLink4Description: http://www.mouser.com/ds/2/308/MMSZ5221BT1-D-85810.pdf; .SCHCHK: USED
footprint D-SOD123
pins: A, C

## D-DDZ9702T-7
designator D?, comment DDZ9702T-7  Case/Package: SOD-523-2
DIODE ZENER 15V 150MW SOD523; Manufacturer: Diodes; Max Reverse Leakage Current: 50nA; Element Configuration: Single; Tolerance: 5%; Test Current: 50uA; Forward Voltage: 900mV; .Creator: F:TALI; .PCBCHK: USED; Washability: OK; Supplier 1: Digi-Key; Manufacturer Part Number: DDZ9702T-7; Stock 1: 53168; Pricing 1: 1=0.51, 10=0.379, 100=0.2146, 500=0.14214, 1000=0.10897 (USD); Mount: Surface Mount; Number of Pins: 2; Weight: 3.5E-05oz; Min Operating Temperature: -65°C; Max Operating Temperature: 150°C; Max Power Dissipation: 150mW; Zener Voltage: 15V; Package Quantity: 3000; Packaging: Tape and Reel; Voltage Tolerance: 5%; Power Dissipation: 150mW; Zener Current: 50nA; Peak Reverse Current: 50nA; Power Rating: 150mW; Length: 1.7mm; Height: 0.65mm; Width: 0.9mm; Radiation Hardening: No; Lead Free: Lead Free; ComponentLink1URL: http://www.diodes.com///datasheets/ds30553.pdf; ComponentLink1Description: http://www.diodes.com///datasheets/ds30553.pdf; Supplier Part Number 1: DDZ9702T-7DIDKR-ND; .SCHCHK: USED
pins: A, C

## D-ES2B-SMB
designator D?, comment ES2B  Forward Current: 2A  Case/Package: SMB